# Altium footprint library PcbLib_ICs.PcbLib: 317 footprints (part 14 of 24) (continued)
## QFN56 [mm] "QFN56 package, 8x8mm, 0.5mm pitch" (continued)
  region: 2,-0.6 2,-0.1 1.5,-0.1 1.5,-0.6
  region: 1.3,-0.6 1.3,-0.1 0.8,-0.1 0.8,-0.6
  region: 0.6,-0.6 0.6,-0.1 0.1,-0.1 0.1,-0.6
  region: -0.1,-0.6 -0.1,-0.1 -0.6,-0.1 -0.6,-0.6
  region: -0.8,-0.6 -0.8,-0.1 -1.3,-0.1 -1.3,-0.6
  region: -1.5,-0.6 -1.5,-0.1 -2,-0.1 -2,-0.6
  region: -3.25,0.6 -3.25,0.1 -2.9,0.1 -2.9,0.6
  region: -2.7,0.6 -2.7,0.1 -2.2,0.1 -2.2,0.6
  region: -2.2,-0.6 -2.2,-0.1 -2.7,-0.1 -2.7,-0.6
  region: -2.9,-0.6 -2.9,-0.1 -3.25,-0.1 -3.25,-0.6
  region: 3.25,-0.6 3.25,-0.1 2.9,-0.1 2.9,-0.6
  region: 2.7,-0.6 2.7,-0.1 2.2,-0.1 2.2,-0.6
  region: 2.2,0.6 2.2,0.1 2.7,0.1 2.7,0.6
  region: 2.9,0.6 2.9,0.1 3.25,0.1 3.25,0.6
  rectangle: 2.2,0.8 2.7,1.3
  rectangle: 2.2,1.5 2.7,2
  rectangle: 2.2,2.2 2.7,2.7
  rectangle: 2.2,2.9 2.7,3.25
  rectangle: 1.5,0.8 2,1.3
  rectangle: 1.5,1.5 2,2
  rectangle: 1.5,2.2 2,2.7
  rectangle: 1.5,2.9 2,3.25
  rectangle: 0.8,0.8 1.3,1.3
  rectangle: 0.8,1.5 1.3,2
  rectangle: 0.8,2.2 1.3,2.7
  rectangle: 0.8,2.9 1.3,3.25
  rectangle: 0.1,0.8 0.6,1.3
  rectangle: 0.1,1.5 0.6,2
  rectangle: 0.1,2.2 0.6,2.7
  rectangle: 0.1,2.9 0.6,3.25
  rectangle: -0.6,0.8 -0.1,1.3
  rectangle: -0.6,1.5 -0.1,2
  rectangle: -0.6,2.2 -0.1,2.7
  rectangle: -0.6,2.9 -0.1,3.25
  rectangle: -1.3,0.8 -0.8,1.3
  rectangle: -1.3,1.5 -0.8,2
  rectangle: -1.3,2.2 -0.8,2.7
  rectangle: -1.3,2.9 -0.8,3.25
  rectangle: -2,0.8 -1.5,1.3
  rectangle: -2,1.5 -1.5,2
  rectangle: -2,2.2 -1.5,2.7
  rectangle: -2,2.9 -1.5,3.25
  rectangle: -2.7,0.8 -2.2,1.3
  rectangle: -2.7,1.5 -2.2,2
  rectangle: -2.7,2.2 -2.2,2.7
  rectangle: -2.7,2.9 -2.2,3.25
  region: -2.2,-0.8 -2.7,-0.8 -2.7,-1.3 -2.2,-1.3
  region: -2.2,-1.5 -2.7,-1.5 -2.7,-2 -2.2,-2
  region: -2.2,-2.2 -2.7,-2.2 -2.7,-2.7 -2.2,-2.7
  region: -2.2,-2.9 -2.7,-2.9 -2.7,-3.25 -2.2,-3.25
  region: -1.5,-0.8 -2,-0.8 -2,-1.3 -1.5,-1.3
  region: -1.5,-1.5 -2,-1.5 -2,-2 -1.5,-2
  region: -1.5,-2.2 -2,-2.2 -2,-2.7 -1.5,-2.7
  region: -1.5,-2.9 -2,-2.9 -2,-3.25 -1.5,-3.25
  region: -0.8,-0.8 -1.3,-0.8 -1.3,-1.3 -0.8,-1.3
  region: -0.8,-1.5 -1.3,-1.5 -1.3,-2 -0.8,-2
  region: -0.8,-2.2 -1.3,-2.2 -1.3,-2.7 -0.8,-2.7
  region: -0.8,-2.9 -1.3,-2.9 -1.3,-3.25 -0.8,-3.25
  region: -0.1,-0.8 -0.6,-0.8 -0.6,-1.3 -0.1,-1.3
  region: -0.1,-1.5 -0.6,-1.5 -0.6,-2 -0.1,-2
  region: -0.1,-2.2 -0.6,-2.2 -0.6,-2.7 -0.1,-2.7
  region: -0.1,-2.9 -0.6,-2.9 -0.6,-3.25 -0.1,-3.25
  region: 0.6,-0.8 0.1,-0.8 0.1,-1.3 0.6,-1.3
  region: 0.6,-1.5 0.1,-1.5 0.1,-2 0.6,-2
  region: 0.6,-2.2 0.1,-2.2 0.1,-2.7 0.6,-2.7
  region: 0.6,-2.9 0.1,-2.9 0.1,-3.25 0.6,-3.25
  region: 1.3,-0.8 0.8,-0.8 0.8,-1.3 1.3,-1.3
  region: 1.3,-1.5 0.8,-1.5 0.8,-2 1.3,-2
  region: 1.3,-2.2 0.8,-2.2 0.8,-2.7 1.3,-2.7
  region: 1.3,-2.9 0.8,-2.9 0.8,-3.25 1.3,-3.25
  region: 2,-0.8 1.5,-0.8 1.5,-1.3 2,-1.3
  region: 2,-1.5 1.5,-1.5 1.5,-2 2,-2
  region: 2,-2.2 1.5,-2.2 1.5,-2.7 2,-2.7
  region: 2,-2.9 1.5,-2.9 1.5,-3.25 2,-3.25
  region: 2.7,-0.8 2.2,-0.8 2.2,-1.3 2.7,-1.3
  region: 2.7,-1.5 2.2,-1.5 2.2,-2 2.7,-2
  region: 2.7,-2.2 2.2,-2.2 2.2,-2.7 2.7,-2.7
  region: 2.7,-2.9 2.2,-2.9 2.2,-3.25 2.7,-3.25
  region: 2.9,-2.2 2.9,-2.7 3.25,-2.7 3.25,-2.2
  region: 2.9,-1.5 2.9,-2 3.25,-2 3.25,-1.5
  region: 2.9,-0.8 2.9,-1.3 3.25,-1.3 3.25,-0.8
  region: -3.25,-2.2 -3.25,-2.7 -2.9,-2.7 -2.9,-2.2
  region: -3.25,-1.5 -3.25,-2 -2.9,-2 -2.9,-1.5
  region: -3.25,-0.8 -3.25,-1.3 -2.9,-1.3 -2.9,-0.8
  region: -2.9,2.2 -2.9,2.7 -3.25,2.7 -3.25,2.2
  region: -2.9,1.5 -2.9,2 -3.25,2 -3.25,1.5
  region: -2.9,0.8 -2.9,1.3 -3.25,1.3 -3.25,0.8
  region: 3.25,2.2 3.25,2.7 2.9,2.7 2.9,2.2
  region: 3.25,1.5 3.25,2 2.9,2 2.9,1.5
  region: 3.25,0.8 3.25,1.3 2.9,1.3 2.9,0.8
Bottom Solder:
  region: -3.25,3.25 -0.75,3.25 0,2.5 0.75,3.25 3.25,3.25 3.25,0.75 2.5,0 3.25,-0.749 3.25,-3.25 0.75,-3.25 0,-2.5 -0.75,-3.25 -3.25,-3.25 -3.25,-0.75 -2.5,0 -3.25,0.75
Top Assy:
  drawing of 173 lines, arcs and shapes, not listed
  text ".Designator" at -3.443,-0.467 h2
Top Text:
  lines w0.05: -4.6,-4.6 4.6,-4.6 4.6,4.6 -4.6,4.6 -4.6,-4.6
  lines w0.1: -0.5,0 0.5,0 ; 0,-0.5 0,0.5
3D body "QFN56_0_5.step": height 0.95, standoff 0, extent -4,-4 4,4

## QFN56_MMPF0100 [mm] "QFN56 package, 8x8mm, 0.5mm pitch"
height 0.9
pads (57):
  rect 0.95x0.3 smd paste+0 mask+0.075: 1(-4.1,3.25)
  oval 0.95x0.3 smd paste+0 mask+0.075: 2(-4.1,2.75) 3(-4.1,2.25) 4(-4.1,1.75) 5(-4.1,1.25) 6(-4.1,0.75) 7(-4.1,0.25) 8(-4.1,-0.25) 9(-4.1,-0.75) 10(-4.1,-1.25) 11(-4.1,-1.75) 12(-4.1,-2.25) 13(-4.1,-2.75) 14(-4.1,-3.25) 29(4.1,-3.25) 30(4.1,-2.75) 31(4.1,-2.25) 32(4.1,-1.75) 33(4.1,-1.25) 34(4.1,-0.75) 35(4.1,-0.25) 36(4.1,0.25) 37(4.1,0.75) 38(4.1,1.25) 39(4.1,1.75) 40(4.1,2.25) 41(4.1,2.75) 42(4.1,3.25)
  oval 0.3x0.95 smd paste+0 mask+0.075: 15(-3.25,-4.1) 16(-2.75,-4.1) 17(-2.25,-4.1) 18(-1.75,-4.1) 19(-1.25,-4.1) 20(-0.75,-4.1) 21(-0.25,-4.1) 22(0.25,-4.1) 23(0.75,-4.1) 24(1.25,-4.1) 25(1.75,-4.1) 26(2.25,-4.1) 27(2.75,-4.1) 28(3.25,-4.1) 43(3.25,4.1) 44(2.75,4.1) 45(2.25,4.1) 46(1.75,4.1) 47(1.25,4.1) 48(0.75,4.1) 49(0.25,4.1) 50(-0.25,4.1) 51(-0.75,4.1) 52(-1.25,4.1) 53(-1.75,4.1) 54(-2.25,4.1) 55(-2.75,4.1) 56(-3.25,4.1)
  rrect15% 6.1x6.1 smd paste-50 mask+0.075: EP(0,0)
via -0.5,-0.5 diameter 0.7 hole 0.3
via 0.5,-0.5 diameter 0.7 hole 0.3
via 0.5,0.5 diameter 0.7 hole 0.3
via -0.5,0.5 diameter 0.7 hole 0.3
via 0.5,-1.5 diameter 0.7 hole 0.3
via -0.5,-1.5 diameter 0.7 hole 0.3
via 1.5,0.5 diameter 0.7 hole 0.3
via 1.5,-0.5 diameter 0.7 hole 0.3
via -1.5,-0.5 diameter 0.7 hole 0.3
via -1.5,0.5 diameter 0.7 hole 0.3
via 0.5,1.5 diameter 0.7 hole 0.3
via -0.5,1.5 diameter 0.7 hole 0.3
via 1.5,-2.5 diameter 0.7 hole 0.3
via 1.5,-1.5 diameter 0.7 hole 0.3
via 2.5,-2.5 diameter 0.7 hole 0.3
via 2.5,-1.5 diameter 0.7 hole 0.3
via -2.5,-1.5 diameter 0.7 hole 0.3
via -1.5,-1.5 diameter 0.7 hole 0.3
via -2.5,-2.5 diameter 0.7 hole 0.3
via -1.5,-2.5 diameter 0.7 hole 0.3
via -1.5,2.5 diameter 0.7 hole 0.3
via -1.5,1.5 diameter 0.7 hole 0.3
via -2.5,2.5 diameter 0.7 hole 0.3
via -2.5,1.5 diameter 0.7 hole 0.3
via 1.5,2.5 diameter 0.7 hole 0.3
via 2.5,2.5 diameter 0.7 hole 0.3
via 1.5,1.5 diameter 0.7 hole 0.3
via 2.5,1.5 diameter 0.7 hole 0.3
Top Overlay:
  circle w0.25: c-4.85,4.05 r0.125
  lines w0.2: -4.2,-3.8 -4.2,-4.2 -3.8,-4.2 ; -4.2,3.8 -4.2,4.2 -3.8,4.2 ; 3.8,-4.2 4.2,-4.2 4.2,-3.8 ; 3.8,4.2 4.2,4.2 4.2,3.8
Top Paste:
  region: -2,0.6 -2,0.1 -1.5,0.1 -1.5,0.6
  region: -1.3,0.6 -1.3,0.1 -0.8,0.1 -0.8,0.6
  region: -0.6,0.6 -0.6,0.1 -0.1,0.1 -0.1,0.6
  region: 0.1,0.6 0.1,0.1 0.6,0.1 0.6,0.6
  region: 0.8,0.6 0.8,0.1 1.3,0.1 1.3,0.6
  region: 1.5,0.6 1.5,0.1 2,0.1 2,0.6
  region: 2,-0.6 2,-0.1 1.5,-0.1 1.5,-0.6
  region: 1.3,-0.6 1.3,-0.1 0.8,-0.1 0.8,-0.6
  region: 0.6,-0.6 0.6,-0.1 0.1,-0.1 0.1,-0.6
  region: -0.1,-0.6 -0.1,-0.1 -0.6,-0.1 -0.6,-0.6
  region: -0.8,-0.6 -0.8,-0.1 -1.3,-0.1 -1.3,-0.6
  region: -1.5,-0.6 -1.5,-0.1 -2,-0.1 -2,-0.6
  region: -3.25,0.6 -3.25,0.1 -2.9,0.1 -2.9,0.6
  region: -2.7,0.6 -2.7,0.1 -2.2,0.1 -2.2,0.6
  region: -2.2,-0.6 -2.2,-0.1 -2.7,-0.1 -2.7,-0.6
  region: -2.9,-0.6 -2.9,-0.1 -3.25,-0.1 -3.25,-0.6
  region: 3.25,-0.6 3.25,-0.1 2.9,-0.1 2.9,-0.6
  region: 2.7,-0.6 2.7,-0.1 2.2,-0.1 2.2,-0.6
  region: 2.2,0.6 2.2,0.1 2.7,0.1 2.7,0.6
  region: 2.9,0.6 2.9,0.1 3.25,0.1 3.25,0.6
  rectangle: 2.2,0.8 2.7,1.3
  rectangle: 2.2,1.5 2.7,2
  rectangle: 2.2,2.2 2.7,2.7
  rectangle: 2.2,2.9 2.7,3.25
  rectangle: 1.5,0.8 2,1.3
  rectangle: 1.5,1.5 2,2
  rectangle: 1.5,2.2 2,2.7
  rectangle: 1.5,2.9 2,3.25
  rectangle: 0.8,0.8 1.3,1.3
  rectangle: 0.8,1.5 1.3,2
  rectangle: 0.8,2.2 1.3,2.7
  rectangle: 0.8,2.9 1.3,3.25
  rectangle: 0.1,0.8 0.6,1.3
  rectangle: 0.1,1.5 0.6,2
  rectangle: 0.1,2.2 0.6,2.7
  rectangle: 0.1,2.9 0.6,3.25
  rectangle: -0.6,0.8 -0.1,1.3
  rectangle: -0.6,1.5 -0.1,2
  rectangle: -0.6,2.2 -0.1,2.7
  rectangle: -0.6,2.9 -0.1,3.25
  rectangle: -1.3,0.8 -0.8,1.3
  rectangle: -1.3,1.5 -0.8,2
  rectangle: -1.3,2.2 -0.8,2.7
  rectangle: -1.3,2.9 -0.8,3.25
  rectangle: -2,0.8 -1.5,1.3
  rectangle: -2,1.5 -1.5,2
  rectangle: -2,2.2 -1.5,2.7
  rectangle: -2,2.9 -1.5,3.25
  rectangle: -2.7,0.8 -2.2,1.3
  rectangle: -2.7,1.5 -2.2,2
  rectangle: -2.7,2.2 -2.2,2.7
  rectangle: -2.7,2.9 -2.2,3.25
  region: -2.2,-0.8 -2.7,-0.8 -2.7,-1.3 -2.2,-1.3
  region: -2.2,-1.5 -2.7,-1.5 -2.7,-2 -2.2,-2
  region: -2.2,-2.2 -2.7,-2.2 -2.7,-2.7 -2.2,-2.7
  region: -2.2,-2.9 -2.7,-2.9 -2.7,-3.25 -2.2,-3.25
  region: -1.5,-0.8 -2,-0.8 -2,-1.3 -1.5,-1.3
  region: -1.5,-1.5 -2,-1.5 -2,-2 -1.5,-2
  region: -1.5,-2.2 -2,-2.2 -2,-2.7 -1.5,-2.7
  region: -1.5,-2.9 -2,-2.9 -2,-3.25 -1.5,-3.25
  region: -0.8,-0.8 -1.3,-0.8 -1.3,-1.3 -0.8,-1.3
  region: -0.8,-1.5 -1.3,-1.5 -1.3,-2 -0.8,-2
  region: -0.8,-2.2 -1.3,-2.2 -1.3,-2.7 -0.8,-2.7
  region: -0.8,-2.9 -1.3,-2.9 -1.3,-3.25 -0.8,-3.25
  region: -0.1,-0.8 -0.6,-0.8 -0.6,-1.3 -0.1,-1.3
  region: -0.1,-1.5 -0.6,-1.5 -0.6,-2 -0.1,-2
  region: -0.1,-2.2 -0.6,-2.2 -0.6,-2.7 -0.1,-2.7
  region: -0.1,-2.9 -0.6,-2.9 -0.6,-3.25 -0.1,-3.25
  region: 0.6,-0.8 0.1,-0.8 0.1,-1.3 0.6,-1.3
  region: 0.6,-1.5 0.1,-1.5 0.1,-2 0.6,-2
  region: 0.6,-2.2 0.1,-2.2 0.1,-2.7 0.6,-2.7
  region: 0.6,-2.9 0.1,-2.9 0.1,-3.25 0.6,-3.25
  region: 1.3,-0.8 0.8,-0.8 0.8,-1.3 1.3,-1.3
  region: 1.3,-1.5 0.8,-1.5 0.8,-2 1.3,-2
  region: 1.3,-2.2 0.8,-2.2 0.8,-2.7 1.3,-2.7
  region: 1.3,-2.9 0.8,-2.9 0.8,-3.25 1.3,-3.25
  region: 2,-0.8 1.5,-0.8 1.5,-1.3 2,-1.3
  region: 2,-1.5 1.5,-1.5 1.5,-2 2,-2
  region: 2,-2.2 1.5,-2.2 1.5,-2.7 2,-2.7
  region: 2,-2.9 1.5,-2.9 1.5,-3.25 2,-3.25
  region: 2.7,-0.8 2.2,-0.8 2.2,-1.3 2.7,-1.3
  region: 2.7,-1.5 2.2,-1.5 2.2,-2 2.7,-2
  region: 2.7,-2.2 2.2,-2.2 2.2,-2.7 2.7,-2.7
  region: 2.7,-2.9 2.2,-2.9 2.2,-3.25 2.7,-3.25
  region: 2.9,-2.2 2.9,-2.7 3.25,-2.7 3.25,-2.2
  region: 2.9,-1.5 2.9,-2 3.25,-2 3.25,-1.5
  region: 2.9,-0.8 2.9,-1.3 3.25,-1.3 3.25,-0.8
  region: -3.25,-2.2 -3.25,-2.7 -2.9,-2.7 -2.9,-2.2
  region: -3.25,-1.5 -3.25,-2 -2.9,-2 -2.9,-1.5
  region: -3.25,-0.8 -3.25,-1.3 -2.9,-1.3 -2.9,-0.8
  region: -2.9,2.2 -2.9,2.7 -3.25,2.7 -3.25,2.2
  region: -2.9,1.5 -2.9,2 -3.25,2 -3.25,1.5
  region: -2.9,0.8 -2.9,1.3 -3.25,1.3 -3.25,0.8
  region: 3.25,2.2 3.25,2.7 2.9,2.7 2.9,2.2
  region: 3.25,1.5 3.25,2 2.9,2 2.9,1.5
  region: 3.25,0.8 3.25,1.3 2.9,1.3 2.9,0.8
Bottom Solder:
  region: -3.25,3.25 -0.75,3.25 0,2.5 0.75,3.25 3.25,3.25 3.25,0.75 2.5,0 3.25,-0.749 3.25,-3.25 0.75,-3.25 0,-2.5 -0.75,-3.25 -3.25,-3.25 -3.25,-0.75 -2.5,0 -3.25,0.75
Top Assy:
  drawing of 173 lines, arcs and shapes, not listed
  text ".Designator" at -3.443,-0.467 h2
Top Text:
  lines w0.05: -4.6,-4.6 4.6,-4.6 4.6,4.6 -4.6,4.6 -4.6,-4.6
  lines w0.1: -0.5,0 0.5,0 ; 0,-0.5 0,0.5
3D body "QFN56_0_5.step": height 0.95, standoff 0, extent -4,-4 4,4

## QFN56_RP2040 [mm] "QFN, 56-Leads, Body 7,00x7,00mm, Pitch 0,40mm, Thermal Pad 3,10x3,10mm, IPC Medium Density"
height 0.9
pads (57):
  rect 0.875x0.2 smd mask+0.05: 1(-3.437,2.6)
  oval 0.875x0.2 smd mask+0.05: 2(-3.437,2.2) 3(-3.437,1.8) 4(-3.437,1.4) 5(-3.437,1) 6(-3.437,0.6) 7(-3.437,0.2) 8(-3.437,-0.2) 9(-3.437,-0.6) 10(-3.437,-1) 11(-3.437,-1.4) 12(-3.437,-1.8) 13(-3.437,-2.2) 14(-3.437,-2.6) 29(3.437,-2.6) 30(3.437,-2.2) 31(3.437,-1.8) 32(3.437,-1.4) 33(3.437,-1) 34(3.437,-0.6) 35(3.437,-0.2) 36(3.437,0.2) 37(3.437,0.6) 38(3.437,1) 39(3.437,1.4) 40(3.437,1.8) 41(3.437,2.2) 42(3.437,2.6)
  oval 0.2x0.875 smd mask+0.05: 15(-2.6,-3.437) 16(-2.2,-3.437) 17(-1.8,-3.437) 18(-1.4,-3.437) 19(-1,-3.437) 20(-0.6,-3.437) 21(-0.2,-3.437) 22(0.2,-3.437) 23(0.6,-3.437) 24(1,-3.437) 25(1.4,-3.437) 26(1.8,-3.437) 27(2.2,-3.437) 28(2.6,-3.437) 43(2.6,3.437) 44(2.2,3.437) 45(1.8,3.437) 46(1.4,3.437) 47(1,3.437) 48(0.6,3.437) 49(0.2,3.437) 50(-0.2,3.437) 51(-0.6,3.437) 52(-1,3.437) 53(-1.4,3.437) 54(-1.8,3.437) 55(-2.2,3.437) 56(-2.6,3.437)
  rrect5% 3.2x3.2 smd paste-3 mask+0.05: EP(0,0)
via 1,-1 diameter 0.7 hole 0.3
via -1,0 diameter 0.7 hole 0.3
via -1,1 diameter 0.7 hole 0.3
via 0,-1 diameter 0.7 hole 0.3
via -1,-1 diameter 0.7 hole 0.3
via 0,1 diameter 0.7 hole 0.3
via 1,1 diameter 0.7 hole 0.3
via 0,0 diameter 0.7 hole 0.3
via 1,0 diameter 0.7 hole 0.3
Top Overlay:
  circle w0.25: c-4.15,3.35 r0.125
  lines w0.2: -3.5,-3.15 -3.5,-3.5 -3.15,-3.5 ; -3.5,3.15 -3.5,3.5 -3.15,3.5 ; 3.15,-3.5 3.5,-3.5 3.5,-3.15 ; 3.15,3.5 3.5,3.5 3.5,3.15
Top Paste:
  rectangle: -0.7,0.1 -0.1,0.7
  rectangle: -1.5,0.1 -0.9,0.7
  region: 0.7,0.7 0.1,0.7 0.1,0.1 0.7,0.1
  region: 1.5,0.7 0.9,0.7 0.9,0.1 1.5,0.1
  rectangle: -0.7,-0.7 -0.1,-0.1
  rectangle: -1.5,-0.7 -0.9,-0.1
  region: 0.7,-0.1 0.1,-0.1 0.1,-0.7 0.7,-0.7
  region: 1.5,-0.1 0.9,-0.1 0.9,-0.7 1.5,-0.7
  rectangle: -0.7,-1.5 -0.1,-0.9
  rectangle: -1.5,-1.5 -0.9,-0.9
  region: 0.7,-0.9 0.1,-0.9 0.1,-1.5 0.7,-1.5
  region: 1.5,-0.9 0.9,-0.9 0.9,-1.5 1.5,-1.5
  region: 0.7,1.5 0.1,1.5 0.1,0.9 0.7,0.9
  region: 1.5,1.5 0.9,1.5 0.9,0.9 1.5,0.9
  rectangle: -0.7,0.9 -0.1,1.5
  rectangle: -1.5,0.9 -0.9,1.5
Bottom Solder:
  region: -2.2,2.2 -0.4,2.2 0,1.8 0.4,2.2 2.2,2.2 2.2,0.4 1.8,0 2.2,-0.4 2.2,-2.2 0.4,-2.2 0,-1.8 -0.4,-2.2 -2.2,-2.2 -2.2,-0.4 -1.8,0 -2.2,0.4
Top Assy:
  drawing of 1423 lines, arcs and shapes, not listed
  text ".Designator" at -3.443,-2.717 h2
Top Text:
  lines w0.05: -3.775,-3.775 -3.775,3.775 3.775,3.775 3.775,-3.775 -3.775,-3.775
  lines w0.1: -0.5,0 0.5,0 ; 0,-0.5 0,0.5
3D body "RP2040_QFN56_04.x_t": height 0.89, standoff -0.01, extent -3.52,-3.52 3.52,3.52

## QFN64 [mm] "QFN64 9mm x 9mm, 0.5mm pitch"
height 1
pads (65):
  rect 0.9x0.25 smd paste+0 mask+0.05: 1(-4.475,3.75)
  oval 0.9x0.25 smd paste+0 mask+0.05: 2(-4.475,3.25) 3(-4.475,2.75) 4(-4.475,2.25) 5(-4.475,1.75) 6(-4.475,1.25) 7(-4.475,0.75) 8(-4.475,0.25) 9(-4.475,-0.25) 10(-4.475,-0.75) 11(-4.475,-1.25) 12(-4.475,-1.75) 13(-4.475,-2.25) 14(-4.475,-2.75) 15(-4.475,-3.25) 16(-4.475,-3.75) 33(4.475,-3.75) 34(4.475,-3.25) 35(4.475,-2.75) 36(4.475,-2.25) 37(4.475,-1.75) 38(4.475,-1.25) 39(4.475,-0.75) 40(4.475,-0.25) 41(4.475,0.25) 42(4.475,0.75) 43(4.475,1.25) 44(4.475,1.75) 45(4.475,2.25) 46(4.475,2.75) 47(4.475,3.25) 48(4.475,3.75)
  oval 0.25x0.9 smd paste+0 mask+0.05: 17(-3.75,-4.475) 18(-3.25,-4.475) 19(-2.75,-4.475) 20(-2.25,-4.475) 21(-1.75,-4.475) 22(-1.25,-4.475) 23(-0.75,-4.475) 24(-0.25,-4.475) 25(0.25,-4.475) 26(0.75,-4.475) 27(1.25,-4.475) 28(1.75,-4.475) 29(2.25,-4.475) 30(2.75,-4.475) 31(3.25,-4.475) 32(3.75,-4.475) 49(3.75,4.475) 50(3.25,4.475) 51(2.75,4.475) 52(2.25,4.475) 53(1.75,4.475) 54(1.25,4.475) 55(0.75,4.475) 56(0.25,4.475) 57(-0.25,4.475) 58(-0.75,4.475) 59(-1.25,4.475) 60(-1.75,4.475) 61(-2.25,4.475) 62(-2.75,4.475) 63(-3.25,4.475) 64(-3.75,4.475)
  rrect10% 4.25x4.25 smd paste-50 mask+0.05: EP(0,0)
via 0,0 diameter 0.7 hole 0.3
via -0.6,0.6 diameter 0.7 hole 0.3
via 0.6,0.6 diameter 0.7 hole 0.3
via 0.8,1.4 diameter 0.7 hole 0.3
via 1.4,0.8 diameter 0.7 hole 0.3
via -0.7,1.4 diameter 0.7 hole 0.3
via -1.4,0.9 diameter 0.7 hole 0.3
via 1.4,-0.9 diameter 0.7 hole 0.3
via 0.7,-1.4 diameter 0.7 hole 0.3
via -1.4,-0.8 diameter 0.7 hole 0.3
via -0.8,-1.4 diameter 0.7 hole 0.3
via -0.6,-0.6 diameter 0.7 hole 0.3
via 0.6,-0.6 diameter 0.7 hole 0.3
Top Overlay:
  circle w0.25: c-5.375,4.575 r0.125
  lines w0.2: -4.725,-4.275 -4.725,-4.725 -4.275,-4.725 ; -4.725,4.275 -4.725,4.725 -4.275,4.725 ; 4.275,-4.725 4.725,-4.725 4.725,-4.275 ; 4.275,4.725 4.725,4.725 4.725,4.275
Top Paste:
  region: 1.5,-0.8 1.5,-1.3 2,-1.3 2,-0.8
  region: 0.8,-0.8 0.8,-1.3 1.3,-1.3 1.3,-0.8
  region: 1.3,-2 1.3,-1.5 0.8,-1.5 0.8,-2
  region: 2,-2 2,-1.5 1.5,-1.5 1.5,-2
  region: -1.3,-0.8 -1.3,-1.3 -0.8,-1.3 -0.8,-0.8
  region: -2,-0.8 -2,-1.3 -1.5,-1.3 -1.5,-0.8
  region: -1.5,-2 -1.5,-1.5 -2,-1.5 -2,-2
  region: -0.8,-2 -0.8,-1.5 -1.3,-1.5 -1.3,-2
  region: 0.1,-0.8 0.1,-1.3 0.6,-1.3 0.6,-0.8
  region: -0.6,-0.8 -0.6,-1.3 -0.1,-1.3 -0.1,-0.8
  region: -0.1,-2 -0.1,-1.5 -0.6,-1.5 -0.6,-2
  region: 0.6,-2 0.6,-1.5 0.1,-1.5 0.1,-2
  region: 1.5,2 1.5,1.5 2,1.5 2,2
  region: 0.8,2 0.8,1.5 1.3,1.5 1.3,2
  region: 1.3,0.8 1.3,1.3 0.8,1.3 0.8,0.8
  region: 2,0.8 2,1.3 1.5,1.3 1.5,0.8
  region: -1.3,2 -1.3,1.5 -0.8,1.5 -0.8,2
  region: -2,2 -2,1.5 -1.5,1.5 -1.5,2
  region: -1.5,0.8 -1.5,1.3 -2,1.3 -2,0.8
  region: -0.8,0.8 -0.8,1.3 -1.3,1.3 -1.3,0.8
  region: 0.1,2 0.1,1.5 0.6,1.5 0.6,2
  region: -0.6,2 -0.6,1.5 -0.1,1.5 -0.1,2
  region: -0.1,0.8 -0.1,1.3 -0.6,1.3 -0.6,0.8
  region: 0.6,0.8 0.6,1.3 0.1,1.3 0.1,0.8
  region: 1.5,0.6 1.5,0.1 2,0.1 2,0.6
  region: 0.8,0.6 0.8,0.1 1.3,0.1 1.3,0.6
  region: 1.3,-0.6 1.3,-0.1 0.8,-0.1 0.8,-0.6
  region: 2,-0.6 2,-0.1 1.5,-0.1 1.5,-0.6
  region: -1.3,0.6 -1.3,0.1 -0.8,0.1 -0.8,0.6
  region: -2,0.6 -2,0.1 -1.5,0.1 -1.5,0.6
  region: -1.5,-0.6 -1.5,-0.1 -2,-0.1 -2,-0.6
  region: -0.8,-0.6 -0.8,-0.1 -1.3,-0.1 -1.3,-0.6
  region: 0.1,0.6 0.1,0.1 0.6,0.1 0.6,0.6
  region: -0.6,0.6 -0.6,0.1 -0.1,0.1 -0.1,0.6
  region: -0.1,-0.6 -0.1,-0.1 -0.6,-0.1 -0.6,-0.6
  region: 0.6,-0.6 0.6,-0.1 0.1,-0.1 0.1,-0.6
Bottom Solder:
  region: -2.2,2.2 -0.4,2.2 0,1.8 0.4,2.2 2.2,2.2 2.2,0.4 1.8,0 2.2,-0.4 2.2,-2.2 0.4,-2.2 0,-1.8 -0.4,-2.2 -2.2,-2.2 -2.2,-0.4 -1.8,0 -2.2,0.4
Top Assy:
  drawing of 197 lines, arcs and shapes, not listed
  text ".Designator" at -3.443,-0.467 h2
Top Text:
  lines w0.05: -4.875,-4.875 -4.875,4.875 4.875,4.875 4.875,-4.875 -4.875,-4.875
  lines w0.1: -0.5,0 0.5,0 ; 0,-0.5 0,0.5
3D body "QFN64.step": height 1, standoff 0, extent -4.655,-4.655 4.655,4.655

## QFN68 [mm] "QFN68, 8x8mm with 0.4mm pitch"
height 1
pads (69):
  rect 0.85x0.2 smd paste+0 mask+0.05: 1(-3.825,3.2)
  oval 0.85x0.2 smd paste+0 mask+0.05: 2(-3.825,2.8) 3(-3.825,2.4) 4(-3.825,2) 5(-3.825,1.6) 6(-3.825,1.2) 7(-3.825,0.8) 8(-3.825,0.4) 9(-3.825,0) 10(-3.825,-0.4) 11(-3.825,-0.8) 12(-3.825,-1.2) 13(-3.825,-1.6) 14(-3.825,-2) 15(-3.825,-2.4) 16(-3.825,-2.8) 17(-3.825,-3.2) 35(3.825,-3.2) 36(3.825,-2.8) 37(3.825,-2.4) 38(3.825,-2) 39(3.825,-1.6) 40(3.825,-1.2) 41(3.825,-0.8) 42(3.825,-0.4) 43(3.825,0) 44(3.825,0.4) 45(3.825,0.8) 46(3.825,1.2) 47(3.825,1.6) 48(3.825,2) 49(3.825,2.4) 50(3.825,2.8) 51(3.825,3.2)
  oval 0.2x0.85 smd paste+0 mask+0.05: 18(-3.2,-3.825) 19(-2.8,-3.825) 20(-2.4,-3.825) 21(-2,-3.825) 22(-1.6,-3.825) 23(-1.2,-3.825) 24(-0.8,-3.825) 25(-0.4,-3.825) 26(0,-3.825) 27(0.4,-3.825) 28(0.8,-3.825) 29(1.2,-3.825) 30(1.6,-3.825) 31(2,-3.825) 32(2.4,-3.825) 33(2.8,-3.825) 34(3.2,-3.825) 52(3.2,3.825) 53(2.8,3.825) 54(2.4,3.825) 55(2,3.825) 56(1.6,3.825) 57(1.2,3.825) 58(0.8,3.825) 59(0.4,3.825) 60(0,3.825) 61(-0.4,3.825) 62(-0.8,3.825) 63(-1.2,3.825) 64(-1.6,3.825) 65(-2,3.825) 66(-2.4,3.825) 67(-2.8,3.825) 68(-3.2,3.825)
  rrect10% 5.7x5.7 smd paste-50 mask+0.102: EP(0,0)
via -1.5,1.5 diameter 0.7 hole 0.3
via -0.75,0.75 diameter 0.7 hole 0.3
via 1.5,0 diameter 0.7 hole 0.3
via 0,-1.5 diameter 0.7 hole 0.3
via -1.5,0 diameter 0.7 hole 0.3
via 0,1.5 diameter 0.7 hole 0.3
via -0.75,1.5 diameter 0.7 hole 0.3
via 0.75,1.5 diameter 0.7 hole 0.3
via 1.5,0.75 diameter 0.7 hole 0.3
via 1.5,-0.75 diameter 0.7 hole 0.3
via 0.75,-1.5 diameter 0.7 hole 0.3
via -0.75,-1.5 diameter 0.7 hole 0.3
via 0,0 diameter 0.7 hole 0.3
via 0.75,0.75 diameter 0.7 hole 0.3
via 1.5,1.5 diameter 0.7 hole 0.3
via 2.25,2.25 diameter 0.7 hole 0.3
via 0.75,2.25 diameter 0.7 hole 0.3
via 2.25,0.75 diameter 0.7 hole 0.3
via 0.75,-0.75 diameter 0.7 hole 0.3
via 1.5,-1.5 diameter 0.7 hole 0.3
via 2.25,-2.25 diameter 0.7 hole 0.3
via 2.25,-0.75 diameter 0.7 hole 0.3
via 0.75,-2.25 diameter 0.7 hole 0.3
via -0.75,-0.75 diameter 0.7 hole 0.3
via -1.5,-1.5 diameter 0.7 hole 0.3
via -2.25,-2.25 diameter 0.7 hole 0.3
via -0.75,-2.25 diameter 0.7 hole 0.3
via -2.25,-0.75 diameter 0.7 hole 0.3
via -2.25,2.25 diameter 0.7 hole 0.3
via -0.75,2.25 diameter 0.7 hole 0.3
via -2.25,0.75 diameter 0.7 hole 0.3
via -1.5,-0.75 diameter 0.7 hole 0.3
via -1.5,0.75 diameter 0.7 hole 0.3
Top Overlay:
  circle w0.25: c-4.85,4.05 r0.125
  lines w0.2: -4.2,-3.7 -4.2,-4.2 -3.7,-4.2 ; -4.2,3.7 -4.2,4.2 -3.7,4.2 ; 3.7,-4.2 4.2,-4.2 4.2,-3.7 ; 3.7,4.2 4.2,4.2 4.2,3.7
Top Paste:
  region: 2.7,-2.7 2.7,-2.2 2.2,-2.2 2.2,-2.7
  region: -2.2,-2.7 -2.2,-2.2 -2.7,-2.2 -2.7,-2.7
  region: -1.5,-2.7 -1.5,-2.2 -2,-2.2 -2,-2.7
  region: -0.8,-2.7 -0.8,-2.2 -1.3,-2.2 -1.3,-2.7
  region: 1.3,-2.7 1.3,-2.2 0.8,-2.2 0.8,-2.7
  region: 2,-2.7 2,-2.2 1.5,-2.2 1.5,-2.7
  region: -0.1,-2.7 -0.1,-2.2 -0.6,-2.2 -0.6,-2.7
  region: 0.6,-2.7 0.6,-2.2 0.1,-2.2 0.1,-2.7
  region: -2.7,2.7 -2.7,2.2 -2.2,2.2 -2.2,2.7
  region: 2.2,2.7 2.2,2.2 2.7,2.2 2.7,2.7
  region: 1.5,2.7 1.5,2.2 2,2.2 2,2.7
  region: 0.8,2.7 0.8,2.2 1.3,2.2 1.3,2.7
  region: -1.3,2.7 -1.3,2.2 -0.8,2.2 -0.8,2.7
  region: -2,2.7 -2,2.2 -1.5,2.2 -1.5,2.7
  region: 0.1,2.7 0.1,2.2 0.6,2.2 0.6,2.7
  region: -0.6,2.7 -0.6,2.2 -0.1,2.2 -0.1,2.7
  region: -2.2,0.8 -2.2,1.3 -2.7,1.3 -2.7,0.8
  region: -2.7,2 -2.7,1.5 -2.2,1.5 -2.2,2
  region: -2.2,-2 -2.2,-1.5 -2.7,-1.5 -2.7,-2
  region: -2.7,-0.8 -2.7,-1.3 -2.2,-1.3 -2.2,-0.8
  region: -2.2,-0.6 -2.2,-0.1 -2.7,-0.1 -2.7,-0.6
  region: -2.7,0.6 -2.7,0.1 -2.2,0.1 -2.2,0.6
  region: 2.2,-0.8 2.2,-1.3 2.7,-1.3 2.7,-0.8
  region: 2.7,-2 2.7,-1.5 2.2,-1.5 2.2,-2
  region: 2.2,2 2.2,1.5 2.7,1.5 2.7,2
  region: 2.7,0.8 2.7,1.3 2.2,1.3 2.2,0.8
  region: 2.2,0.6 2.2,0.1 2.7,0.1 2.7,0.6
  region: 2.7,-0.6 2.7,-0.1 2.2,-0.1 2.2,-0.6
  region: 1.5,-0.8 1.5,-1.3 2,-1.3 2,-0.8
  region: 0.8,-0.8 0.8,-1.3 1.3,-1.3 1.3,-0.8
  region: 1.3,-2 1.3,-1.5 0.8,-1.5 0.8,-2
  region: 2,-2 2,-1.5 1.5,-1.5 1.5,-2
  region: -1.3,-0.8 -1.3,-1.3 -0.8,-1.3 -0.8,-0.8
  region: -2,-0.8 -2,-1.3 -1.5,-1.3 -1.5,-0.8
  region: -1.5,-2 -1.5,-1.5 -2,-1.5 -2,-2
  region: -0.8,-2 -0.8,-1.5 -1.3,-1.5 -1.3,-2
  region: 0.1,-0.8 0.1,-1.3 0.6,-1.3 0.6,-0.8
  region: -0.6,-0.8 -0.6,-1.3 -0.1,-1.3 -0.1,-0.8
  region: -0.1,-2 -0.1,-1.5 -0.6,-1.5 -0.6,-2
  region: 0.6,-2 0.6,-1.5 0.1,-1.5 0.1,-2
  region: 1.5,2 1.5,1.5 2,1.5 2,2
  region: 0.8,2 0.8,1.5 1.3,1.5 1.3,2
  region: 1.3,0.8 1.3,1.3 0.8,1.3 0.8,0.8
  region: 2,0.8 2,1.3 1.5,1.3 1.5,0.8
  region: -1.3,2 -1.3,1.5 -0.8,1.5 -0.8,2
  region: -2,2 -2,1.5 -1.5,1.5 -1.5,2
  region: -1.5,0.8 -1.5,1.3 -2,1.3 -2,0.8
  region: -0.8,0.8 -0.8,1.3 -1.3,1.3 -1.3,0.8
  region: 0.1,2 0.1,1.5 0.6,1.5 0.6,2
  region: -0.6,2 -0.6,1.5 -0.1,1.5 -0.1,2
  region: -0.1,0.8 -0.1,1.3 -0.6,1.3 -0.6,0.8
  region: 0.6,0.8 0.6,1.3 0.1,1.3 0.1,0.8
  region: 1.5,0.6 1.5,0.1 2,0.1 2,0.6
  region: 0.8,0.6 0.8,0.1 1.3,0.1 1.3,0.6
  region: 1.3,-0.6 1.3,-0.1 0.8,-0.1 0.8,-0.6
  region: 2,-0.6 2,-0.1 1.5,-0.1 1.5,-0.6
  region: -1.3,0.6 -1.3,0.1 -0.8,0.1 -0.8,0.6
  region: -2,0.6 -2,0.1 -1.5,0.1 -1.5,0.6
  region: -1.5,-0.6 -1.5,-0.1 -2,-0.1 -2,-0.6
  region: -0.8,-0.6 -0.8,-0.1 -1.3,-0.1 -1.3,-0.6
  region: 0.1,0.6 0.1,0.1 0.6,0.1 0.6,0.6
  region: -0.6,0.6 -0.6,0.1 -0.1,0.1 -0.1,0.6
  region: -0.1,-0.6 -0.1,-0.1 -0.6,-0.1 -0.6,-0.6
  region: 0.6,-0.6 0.6,-0.1 0.1,-0.1 0.1,-0.6
Bottom Solder:
  region: -3.25,3.25 -0.5,3.25 0,2.75 0.5,3.25 3.25,3.25 3.25,0.5 2.75,0 3.25,-0.5 3.25,-3.25 0.5,-3.25 0,-2.75 -0.5,-3.25 -3.25,-3.25 -3.25,-0.5 -2.75,0 -3.25,0.5
Top Assy:
  drawing of 209 lines, arcs and shapes, not listed
  text ".Designator" at -3.443,-0.467 h2
Top Text:
  lines w0.05: -4.35,-4.35 -4.35,4.35 4.35,4.35 4.35,-4.35 -4.35,-4.35
  lines w0.1: -0.5,0 0.5,0 ; 0,-0.5 0,0.5
3D body "QFN-68.STEP": height 1, standoff 0, extent -4,-4 4,4